# Altium schematic symbol library Altium_Lib.SchLib: 403 symbols (part 3 of 4) (continued)
## RELAY__PCH-105L2M,000 (continued)
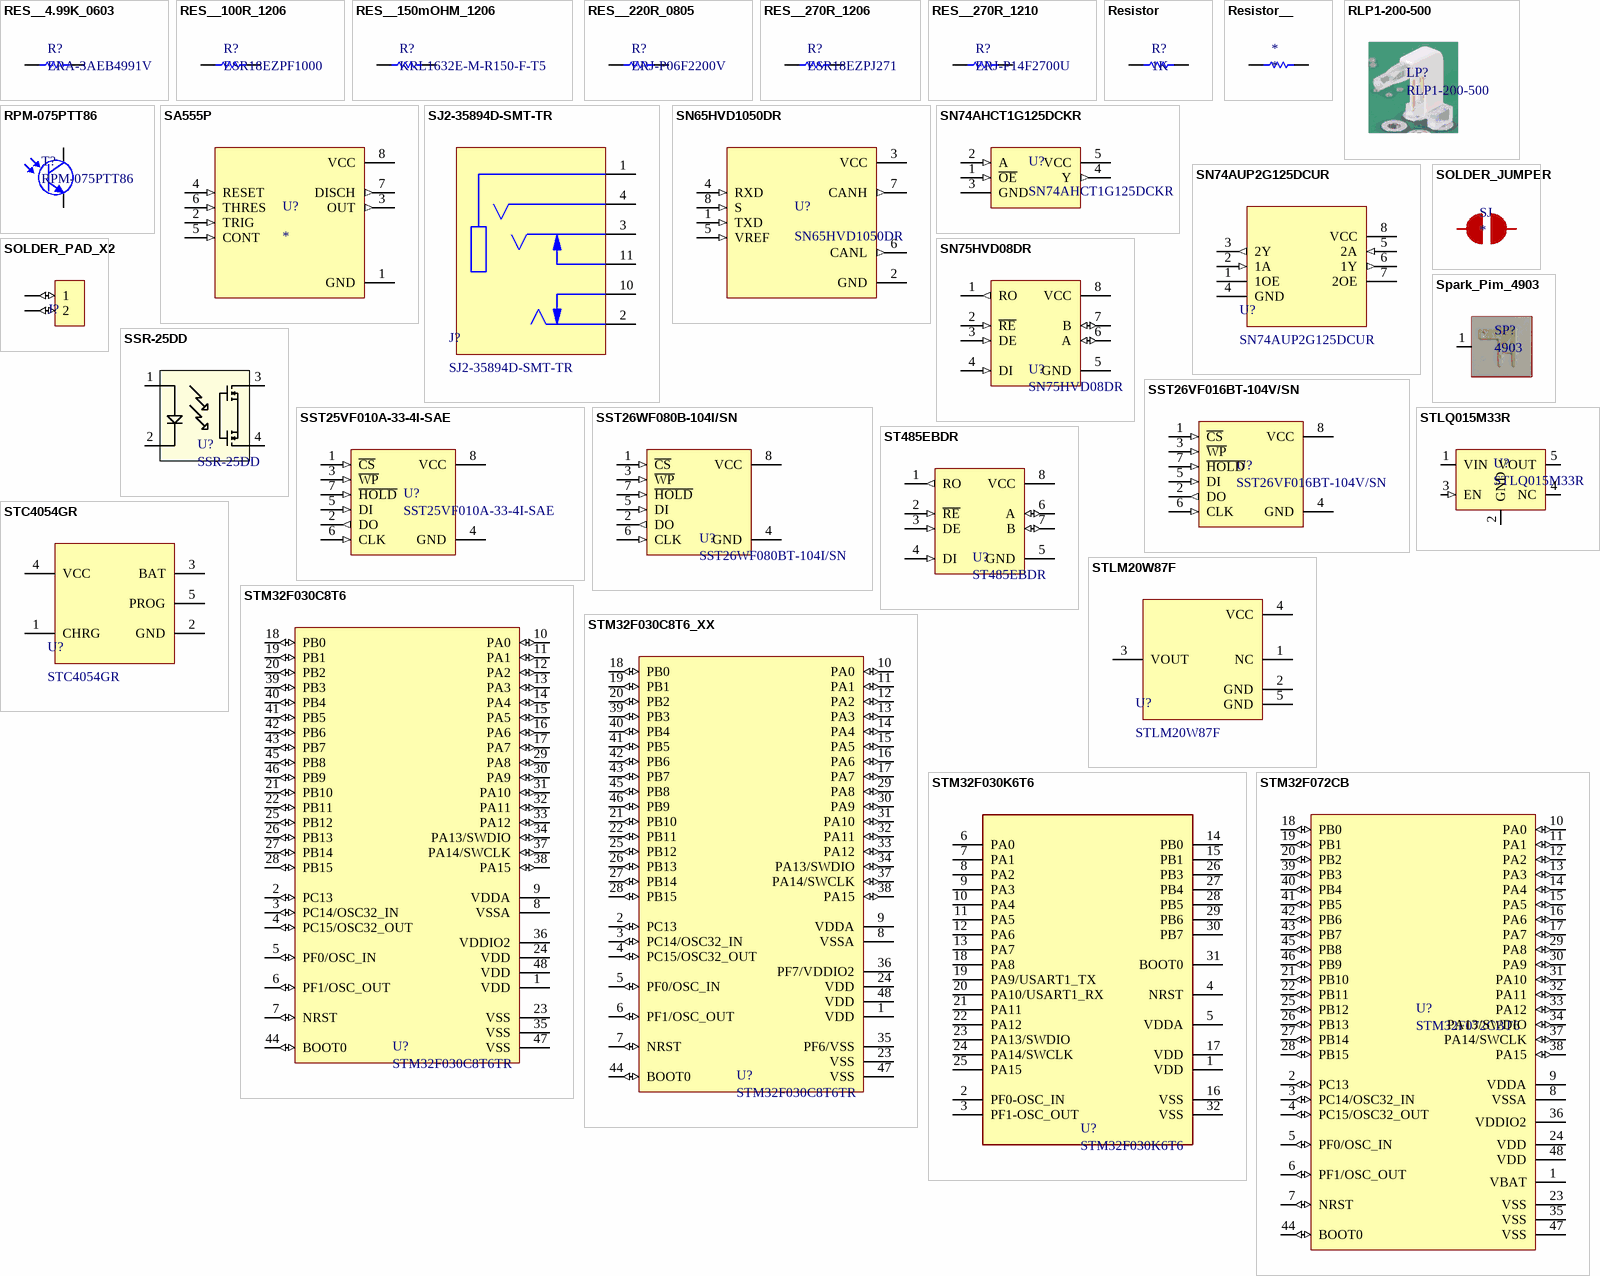
[diagram p8: symbols RES__4.99K_0603 to STM32F072CB]

## RES__4.99K_0603
designator R?, comment ERA-3AEB4991V
RES SMD 4.99KOHM 0.1% 1/10W 0603; Manufacturer: Panasonic Electronic Components; Temperature Coefficient: ±25ppm/°C; Power (Watts): 0.1W, 1/10W; Resistance: 4.99K; Height - Seated (Max): 0.022" (0.55mm); Supplier Device Package: 0603; Size / Dimension: 0.063" L x 0.032" W (1.60mm x 0.80mm); Failure Rate: -; Composition: Thin Film; Tolerance: ±0.1%; Operating Temperature: -55°C ~ 155°C; Package / Case: 0603 (1608 Metric); Supplier: Digi-Key; Packaging: Cut Tape (CT); Part Status: Active; RoHS: RoHS Compliant; Manufacturer Part Number: ERA-3AEB4991V; Category: Resistors; Features: Automotive AEC-Q200; ComponentLink1URL: https://industrial.panasonic.com/cdbs/www-data/pdf/RDM0000/AOA0000C307.pdf; ComponentLink1Description: https://industrial.panasonic.com/cdbs/www-data/pdf/RDM0000/AOA0000C307.pdf; Pricing: 1=0.35, 10=0.3, 100=0.1172, 1000=0.04906, 2500=0.04498 (USD); Supplier Part Number: P4.99KDBCT-ND
footprint R-0603 (Chip Resistor; Body 1.6 x 0.8 mm (LxW typ))
pins: 1, 2

## RES__100R_1206
designator R?, comment ESR18EZPF1000
RES SMD 100 OHM 1% 1/2W 1206; Manufacturer: Rohm Semiconductor; Temperature Coefficient: ±100ppm/°C; Power (Watts): 0.5W, 1/2W; Resistance: 100 Ohms; Supplier: Digi-Key; Category: Resistors; RoHS: RoHS Compliant; Manufacturer Part Number: ESR18EZPF1000; Operating Temperature: -55°C ~ 155°C; Failure Rate: -; Composition: Thick Film; Features: Automotive AEC-Q200, Pulse Withstanding; Package / Case: 1206 (3216 Metric); Supplier Device Package: 1206; Part Status: Active; Tolerance: ±1%; Height - Seated (Max): 0.026" (0.65mm); Size / Dimension: 0.126" L x 0.063" W (3.20mm x 1.60mm); Packaging: Cut Tape (CT); ComponentLink1URL: https://www.rohm.com/datasheet/ESR01MZPF/esr-e; ComponentLink1Description: https://www.rohm.com/datasheet/ESR01MZPF/esr-e; Pricing: 1=0.16, 10=0.133, 100=0.052, 1000=0.02178, 2500=0.01996 (USD); Supplier Part Number: RHM100AFCT-ND
footprint R-1206 (Chip Resistor; Body 3.2 x 1.6 mm (LxW typ))
pins: 1, 2

## RES__150mOHM_1206
designator R?, comment KRL1632E-M-R150-F-T5
RES 0.15 OHM 1% 3/4W 1206; Manufacturer: Susumu; Temperature Coefficient: ±50ppm/°C; Power (Watts): 0.75W, 3/4W; Resistance: 150mOHM; Manufacturer Part Number: KRL1632E-M-R150-F-T5; Category: Resistors; Supplier: Digi-Key; RoHS: RoHS Compliant; Packaging: Cut Tape (CT); Failure Rate: -; Tolerance: ±1%; Features: Automotive AEC-Q200, Current Sense; Operating Temperature: -55°C ~ 155°C; Part Status: Active; Height - Seated (Max): 0.028" (0.70mm); Supplier Device Package: 1206; Package / Case: 1206 (3216 Metric); Size / Dimension: 0.126" L x 0.063" W (3.20mm x 1.60mm); Composition: Metal Foil; ComponentLink1URL: http://www.susumu.co.jp/common/pdf/n_catalog_partition09_en.pdf; ComponentLink1Description: http://www.susumu.co.jp/common/pdf/n_catalog_partition09_en.pdf; Pricing: 1=0.54, 10=0.385, 25=0.3004, 50=0.2542, 100=0.2002, 250=0.1694, 500=0.1386, 1000=0.1078 (USD); Supplier Part Number: 408-1584-1-ND
footprint R-1206 (Chip Resistor; Body 3.2 x 1.6 mm (LxW typ))
pins: 1, 2

## RES__220R_0805
designator R?, comment ERJ-P06F2200V
RES SMD 220 OHM 1% 1/2W 0805; Manufacturer: Panasonic; Power Rating: 500 mW (1/2 W); Resistance: 220 Ohms; Temperature Coefficient: 300 PPM / C; Voltage Rating: 400 V; Qualification: AEC-Q200; Supplier 1: Mouser; Manufacturer Part Number: ERJ-P06F2200V; RoHS: RoHS Compliant By Exemption; Category: Thick Film Resistors - SMD; Stock 1: 11916; Pricing 1: 1=0.180, 10=0.098, 50=0.081, 100=0.055, 500=0.036, 1000=0.025, 5000=0.021 (USD); Application: Automotive Grade; Features: Anti-Surge Resistors; Height: 0.6 mm; Length: 2 mm; Package / Case: -; Packaging: Cut Tape; Product: Thick Film Resistors SMD; Series: ERJ-P; Technology: Thick Film; Termination Style: SMD/SMT; Tolerance: 1 %; Type: Anti-Surge Resistor; Width: 1.2 mm; Brand: Panasonic; Mounting Style: PCB Mount; Case Code - in: 0805; Case Code - mm: 2012; Maximum Operating Temperature: + 155 C; Minimum Operating Temperature: - 55 C; Product Type: Thick Film Resistors; Standard Pack Qty: 5000; Subcategory: Resistors; RoHS - Mouser: E; Minimum Order Quantity: 1; Reeling: True; ComponentLink1URL: https://www.mouser.com/datasheet/2/315/AOA0000C331-1141874.pdf; ComponentLink1Description: https://www.mouser.com/datasheet/2/315/AOA0000C331-1141874.pdf; Supplier Part Number 1: 667-ERJ-P06F2200V
footprint R-0805 (Chip Resistor; Body 2.0 x 1.3 mm (LxW typ))
pins: 1, 2

## RES__270R_1206
designator R?, comment ESR18EZPJ271
RES SMD 270 OHM 5% 1/2W 1206; Manufacturer: Rohm Semiconductor; Power (Watts): 0.5W, 1/2W; Temperature Coefficient: ±200ppm/°C; Resistance: 270 Ohms; Manufacturer Part Number: ESR18EZPJ271; RoHS: RoHS Compliant; Supplier: Digi-Key; Supplier Device Package: 1206; Packaging: Cut Tape (CT); Composition: Thick Film; Part Status: Active; Tolerance: ±5%; Height - Seated (Max): 0.026" (0.65mm); Features: Automotive AEC-Q200, Pulse Withstanding; Package / Case: 1206 (3216 Metric); Failure Rate: -; Operating Temperature: -55°C ~ 155°C; Size / Dimension: 0.126" L x 0.063" W (3.20mm x 1.60mm); Category: Resistors; ComponentLink1URL: https://www.rohm.com/datasheet/ESR01MZPF/esr-e; ComponentLink1Description: https://www.rohm.com/datasheet/ESR01MZPF/esr-e; Pricing: 1=0.17, 10=0.146, 100=0.0572, 1000=0.02396, 2500=0.02196 (USD); Supplier Part Number: RHM270ICT-ND
footprint R-1206 (Chip Resistor; Body 3.2 x 1.6 mm (LxW typ))
pins: 1, 2

## RES__270R_1210
designator R?, comment ERJ-P14F2700U
RES SMD 270 OHM 1% 1/2W 1210; Manufacturer: Panasonic Electronic Components; Power (Watts): 0.5W, 1/2W; Temperature Coefficient: ±100ppm/°C; Resistance: 270; Part Status: Active; Failure Rate: -; Composition: Thick Film; Tolerance: ±1%; Category: Resistors; Manufacturer Part Number: ERJ-P14F2700U; Operating Temperature: -55°C ~ 155°C; Supplier Device Package: 1210; Packaging: Cut Tape (CT); Supplier: Digi-Key; Features: Automotive AEC-Q200, Pulse Withstanding; Package / Case: 1210 (3225 Metric); Size / Dimension: 0.126" L x 0.098" W (3.20mm x 2.50mm); RoHS: RoHS Compliant; Height - Seated (Max): 0.028" (0.70mm); ComponentLink1URL: https://industrial.panasonic.com/cdbs/www-data/pdf/RDO0000/AOA0000C331.pdf; ComponentLink1Description: https://industrial.panasonic.com/cdbs/www-data/pdf/RDO0000/AOA0000C331.pdf; Pricing: 1=0.54, 10=0.387, 100=0.1548, 1000=0.07628, 2500=0.07067 (USD); Supplier Part Number: P16108CT-ND
footprint R-1210 (Chip Resistor; Body 3.2 x 2.5 mm (LxW typ))
pins: 1, 2

## Resistor
designator R?, comment 1K
Manufacturer Part Number: 1K
footprint R-0402 (Chip Resistor, 2-Leads, Body 1.0x0.5mm, IPC Medium Density)
footprint R-0603 (Chip Resistor; Body 1.6 x 0.8 mm (LxW typ))
footprint R-0805 (Chip Resistor; Body 2.0 x 1.3 mm (LxW typ))
footprint R-1206 (Chip Resistor; Body 3.2 x 1.6 mm (LxW typ))
footprint R-1210 (Chip Resistor; Body 3.2 x 2.5 mm (LxW typ))
footprint R-2512 (Chip Resistor; Body 6.3 x 3.2 mm (LxW typ))
pins: 1, 2

## Resistor__
designator *
footprint R-0402 (Chip Resistor, 2-Leads, Body 1.0x0.5mm, IPC Medium Density)
pins: 1, 2

## RLP1-200-500
designator LP?
RIGHT ANGLE LIGHT PIPE, 2.8MM; Manufacturer: Bivar Inc.; Lens Style: Round with Flat Top; Configuration: Single; Lens Size: 2.8mm; Mounting Type: Board Mount, Snap-In, Right Angle; Type: Rigid; Supplier: Digi-Key; Color: Clear; Part Status: Active; RoHS: RoHS Compliant; Category: Optoelectronics; Manufacturer Part Number: RLP1-200-500; ComponentLink1URL: http://www.bivar.com/portals/0/products/RLP1-XXX-XXX.pdf; ComponentLink1Description: http://www.bivar.com/portals/0/products/RLP1-XXX-XXX.pdf; Pricing: 1=1.37, 10=1.112, 25=0.8552, 100=0.7695, 250=0.684, 500=0.5814, 1000=0.4788, 2500=0.456 (USD); Stock: 13046; Supplier Part Number: 492-1462-ND
footprint RLP1-200-500

## RPM-075PTT86
designator T?
PHOTOTRANS 600NM 0805 SMD; Manufacturer: Rohm Semiconductor; Viewing Angle: 120°; Current - Collector (Ic) (Max): 10mA; Voltage - Collector Emitter Breakdown (Max): 20V; Power - Max: 50mW; Part Status: Not For New Designs; Wavelength: 600nm; Category: Sensors, Transducers; Operating Temperature: -30°C ~ 85°C (TA); Orientation: Top View; Mounting Type: Surface Mount; Supplier: Digi-Key; Package / Case: Nonstandard SMD; Manufacturer Part Number: RPM-075PTT86; RoHS: RoHS Compliant; Packaging: Tape & Reel (TR); ComponentLink1URL: http://media.digikey.com/pdf/Data%20Sheets/Rohm%20PDFs/RPM-075PT.pdf; ComponentLink1Description: http://media.digikey.com/pdf/Data%20Sheets/Rohm%20PDFs/RPM-075PT.pdf; Pricing: 3000=0.2352, 6000=0.2268, 15000=0.22344, 30000=0.2184 (USD); Supplier Part Number: 511-1356-2-ND
footprint P-0805
pins: 1 E, 2 C

## SA555P
designator U?
Precision timer for -55 to 85C operation 8-PDIP -40 to 85; MF: Texas Instruments; MP: SA555P; Max Supply Voltage: 16V; Min Supply Voltage: 4.5V; Number of Timers/Counters: 1; Frequency: 500kHz; High Level Output Current: -200mA; Operating Supply Current: 10mA; Quiescent Current: 15mA; Low Level Output Current: 200mA; Operating Supply Voltage: 5V; Check_prices: https://www.snapeda.com/parts/SA555P/Texas%20Instruments/view-part/46237/?ref=eda; SnapEDA_Link: https://www.snapeda.com/parts/SA555P/Texas%20Instruments/view-part/46237/?ref=snap; Digi-Key_Part_Number: SA555PG4-ND; Value: *; Purchase-URL: https://pricing.snapeda.com/search/part/SA555P/?ref=eda; Package: PDIP-8 Texas; Supplier 1: Digi-Key; Manufacturer: Texas Instruments; Manufacturer Part Number: SA555P; RoHS: Yes; Category: Timers and Oscillators; Stock 1: 3835; Pricing 1: 1=0,46000, 10=0,37400, 25=0,34200, 100=0,25460, 250=0,23076, 500=0,19098, 1000=0,14323, 2500=0,13137 (USD); Mount: Through Hole; Case/Package: PDIP; Number of Pins: 8; Weight: 0.015535oz; Contact Plating: Gold; Min Operating Temperature: -40°C; Max Operating Temperature: 85°C; Packaging: Rail/Tube; Package Quantity: 50; Input Current: 15mA; Length: 9.81mm; Width: 6.35mm; Height: 4.57mm; Radiation Hardening: No; REACH SVHC: No SVHC; Lead Free: Lead Free; RoHS Compliant: Yes; ComponentLink1URL: https://datasheet.ciiva.com/14094/ne555-series-eng-tds-14094952.pdf?src-supplier=Distrelec; ComponentLink1Description: https://datasheet.ciiva.com/14094/ne555-series-eng-tds-14094952.pdf?src-supplier=Distrelec; ComponentLink2URL: https://datasheet.ciiva.com/1492/1851962-1492581.pdf?src-supplier=Element14; ComponentLink2Description: https://datasheet.ciiva.com/1492/1851962-1492581.pdf?src-supplier=Element14; ComponentLink3URL: https://datasheet.ciiva.com/1233/sa555-1233482.pdf?src-supplier=Digi-Key; ComponentLink3Description: https://datasheet.ciiva.com/1233/sa555-1233482.pdf?src-supplier=Digi-Key; ComponentLink4URL: https://datasheet.ciiva.com/19480/909290-19480021.pdf?src-supplier=Jameco; ComponentLink4Description: https://datasheet.ciiva.com/19480/909290-19480021.pdf?src-supplier=Jameco; ComponentLink5URL: https://datasheet.ciiva.com/14274/se555m-14274472.pdf?src-supplier=Avnet; ComponentLink5Description: https://datasheet.ciiva.com/14274/se555m-14274472.pdf?src-supplier=Avnet; ComponentLink6URL: https://datasheet.ciiva.com/15152/getdatasheetpartid-39665-15152541.pdf?src-supplier=Verical; ComponentLink6Description: https://datasheet.ciiva.com/15152/getdatasheetpartid-39665-15152541.pdf?src-supplier=Verical; ComponentLink7URL: https://datasheet.ciiva.com/26228/se555m-26228889.pdf?src-supplier=Avnet+Europe; ComponentLink7Description: https://datasheet.ciiva.com/26228/se555m-26228889.pdf?src-supplier=Avnet+Europe; ComponentLink8URL: https://datasheet.ciiva.com/29305/152223-da-01-en-sa555p-timer-tid-29305226.pdf?src-supplier=Conrad; ComponentLink8Description: https://datasheet.ciiva.com/29305/152223-da-01-en-sa555p-timer-tid-29305226.pdf?src-supplier=Conrad; Supplier Part Number 1: 296-9682-5-ND
footprint PDIP-8 (Footprint not found)
pins: 1 GND (power), 2 TRIG (in), 3 OUT (out), 4 RESET (in), 5 CONT (in), 6 THRES (in), 7 DISCH (out), 8 VCC (power)

## SJ2-35894D-SMT-TR
designator J?
3.5 mm, Stereo, Right Angle, Surface Mount (SMT), Audio Jack Connector; Manufacturer: CUI; Number of Conductors: 4; Number of Ports: 1; Shielding: Unshielded; Supplier 1: Digi-Key; Manufacturer Part Number: SJ2-35894D-SMT-TR; RoHS: Yes; Category: Audio / Video Cables; Color: Black; Connector Type: Jack; Orientation: Horizontal; ComponentLink1URL: https://www.cui.com/product/resource/digikeypdf/sj2-3589x-smt.pdf?src-supplier=Digi-Key; ComponentLink1Description: https://www.cui.com/product/resource/digikeypdf/sj2-3589x-smt.pdf?src-supplier=Digi-Key; Supplier Part Number 1: CP-SJ2-35894D-SMT-CT-ND
footprint CUI_SJ2-35894D-SMT-TR (Footprint not found)
pins: 1 SLEEVE, 2 TIP, 3 RING1, 4 RING2, 10 TIP_SWITCH, 11 RING1_SWITCH

## SN65HVD1050DR
designator U?
High-Speed CAN Transceiver with Silent Mode 8-SOIC -40 to 125; MF: Texas Instruments; Min Supply Voltage: 4.75V; Max Supply Voltage: 5.25V; Data Rate: 1Mbps; Number of Transceivers: 1; Operating Supply Voltage: 5V; Nominal Supply Current: 70mA; Purchase-URL: https://pricing.snapeda.com/search/part/SN65HVD1050DR/?ref=eda; Digi-Key_Part_Number: 296-26335-1-ND; MP: SN65HVD1050DR; Check_prices: https://www.snapeda.com/parts/SN65HVD1050DR/Texas%20Instruments/view-part/1043210/?ref=eda; SnapEDA_Link: https://www.snapeda.com/parts/SN65HVD1050DR/Texas%20Instruments/view-part/1043210/?ref=snap; Value: *; Package: SOIC-8 Texas Instruments; Supplier 1: Digi-Key; Manufacturer: Texas Instruments; Manufacturer Part Number: SN65HVD1050DR; RoHS: Yes; Category: Interface ICs; Pricing 1: 1=1,69000, 10=1,51300, 25=1,43640, 100=1,18000, 250=1,10304, 500=0,97478, 1000=0,84700 (USD); Case/Package: D; Number of Pins: 8; Weight: 0.002677oz; Contact Plating: Gold; Min Operating Temperature: -40°C; Max Operating Temperature: 125°C; Packaging: Tape and Reel; Package Quantity: 2500; Max Supply Current: 70mA; Number of Drivers: 1; Number of Receivers: 1; Series: -; Supply Current: 70mA; Number of Transmit Buffers: 1; Number of Receive Buffers: 1; Radiation Hardening: No; Lead Free: Lead Free; RoHS Compliant: Yes; REACH SVHC: No SVHC; ComponentLink1URL: https://datasheet.ciiva.com/26828/sn65hvd1050dr-26828644.pdf?src-supplier=IIIC; ComponentLink1Description: https://datasheet.ciiva.com/26828/sn65hvd1050dr-26828644.pdf?src-supplier=IIIC; ComponentLink2URL: https://datasheet.ciiva.com/46392/1888948-46392549.pdf?src-supplier=Element14; ComponentLink2Description: https://datasheet.ciiva.com/46392/1888948-46392549.pdf?src-supplier=Element14; ComponentLink3URL: https://datasheet.ciiva.com/1701/sn65hvd1050-1701693.pdf?src-supplier=Digi-Key; ComponentLink3Description: https://datasheet.ciiva.com/1701/sn65hvd1050-1701693.pdf?src-supplier=Digi-Key; ComponentLink4URL: https://datasheet.ciiva.com/1701/sn65hvd1050-1701694.pdf?src-supplier=Digi-Key; ComponentLink4Description: https://datasheet.ciiva.com/1701/sn65hvd1050-1701694.pdf?src-supplier=Digi-Key; ComponentLink5URL: https://datasheet.ciiva.com/1701/sn65hvd1050-1701695.pdf?src-supplier=Digi-Key; ComponentLink5Description: https://datasheet.ciiva.com/1701/sn65hvd1050-1701695.pdf?src-supplier=Digi-Key; Supplier Part Number 1: 296-26335-6-ND
footprint SOIC-8_L (SOIC, 8-Leads, Body 4.9x3.9mm, Pitch 1.27mm, IPC High Density)
pins: 1 TXD (in), 2 GND (power), 3 VCC (power), 4 RXD (in), 5 VREF (in), 6 CANL (out), 7 CANH (out), 8 S (in)

## SN74AHCT1G125DCKR
designator U?
IC BUF NON-INVERT 5.5V SC70-5; Manufacturer: Texas Instruments; Voltage - Supply: 4.5 V ~ 5.5 V; Number of Bits per Element: 1; Logic Type: Buffer, Non-Inverting; Output Type: 3-State; Current - Output High, Low: 8mA, 8mA; Manufacturer Part Number: SN74AHCT1G125DCKR; Package / Case: 5-TSSOP, SC-70-5, SOT-353; Supplier: Digi-Key; RoHS: RoHS Compliant; Operating Temperature: -40°C ~ 125°C (TA); Part Status: Active; Input Type: -; Mounting Type: Surface Mount; Supplier Device Package: SC-70-5; Category: Integrated Circuits (ICs); Base Part Number: 74AHCT1G125; Packaging: Cut Tape (CT); ComponentLink1URL: http://www.ti.com/lit/ds/symlink/sn74ahct1g125.pdf; ComponentLink1Description: http://www.ti.com/lit/ds/symlink/sn74ahct1g125.pdf; Pricing: 1=0.43, 10=0.32, 100=0.1996, 500=0.13658, 1000=0.10506 (USD); Supplier Part Number: 296-4709-1-ND
footprint SC-70-5
pins: 1 ~{OE} (in), 2 A (in), 3 GND (power), 4 Y (out), 5 VCC (power)

## SN74AUP2G125DCUR
designator U?
Low-Power Dual Bus Buffer Gate With 3-State Outputs 8-VSSOP -40 to 85; Manufacturer: Texas Instruments; Max Supply Voltage: 3.6V; Min Supply Voltage: 800mV; Propagation Delay: 6.5ns; Number of Elements: 2; Logic Function: Buffer,Inverting; Low Level Output Current: 4mA; Number of Input Lines: 4; Polarity: Non-Inverting; Number of Bits per Element: 1; High Level Output Current: -4mA; Quiescent Current: 500nA; Supplier 1: Avnet; Manufacturer Part Number: SN74AUP2G125DCUR; Stock 1: 0; Mount: Surface Mount; Case/Package: VSSOP; Number of Pins: 8; Min Operating Temperature: -40°C; Max Operating Temperature: 85°C; Package Quantity: 3000; Packaging: Tape and Reel; Number of Channels: 2; Number of Inputs: 2; Number of Outputs: 2; Number of Output Lines: 4; Number of Bits: 2; Output Type: 3-STATE; Series: 74AUP; Technology: CMOS; Lead Free: Lead Free; RoHS Compliant: Yes; ComponentLink1URL: http://www.ti.com/lit/ds/symlink/sn74aup2g125.pdf?src-supplier=Digi-Key; ComponentLink1Description: http://www.ti.com/lit/ds/symlink/sn74aup2g125.pdf?src-supplier=Digi-Key; ComponentLink2URL: http://www.ti.com/general/docs/lit/getliterature.tsp?genericPartNumber=SN74AUP2G125&&fileType=pdf&src-supplier=Avnet; ComponentLink2Description: http://www.ti.com/general/docs/lit/getliterature.tsp?genericPartNumber=SN74AUP2G125&&fileType=pdf&src-supplier=Avnet; Supplier Part Number 1: SN74AUP2G125DCUR
footprint VFSOP_8
pins: 1 1OE, 2 1A (in), 3 2Y (out), 4 GND, 5 2A (in), 6 1Y (out), 7 2OE, 8 VCC

## SN75HVD08DR
designator U?
IC RS485 TXRX 3/5V 8-SOIC; Manufacturer: Texas Instruments; Number of Drivers/Receivers: 1/1; Protocol: RS422, RS485; Voltage - Supply: 3 V ~ 5.5 V; Data Rate: 10Mbps; Duplex: Half; Operating Temperature: 0°C ~ 70°C; RoHS: RoHS Compliant; Package / Case: 8-SOIC (0.154", 3.90mm Width); Mounting Type: Surface Mount; Supplier: Digi-Key; Supplier Device Package: 8-SOIC; Manufacturer Part Number: SN75HVD08DR; Packaging: Tape & Reel (TR); Part Status: Active; Category: Integrated Circuits (ICs); Type: Transceiver; ComponentLink1URL: http://www.ti.com/lit/ds/symlink/sn75hvd08.pdf; ComponentLink1Description: http://www.ti.com/lit/ds/symlink/sn75hvd08.pdf; Supplier Part Number: 296-37893-2-ND
footprint SOIC-8_L (SOIC, 8-Leads, Body 4.9x3.9mm, Pitch 1.27mm, IPC High Density)
pins: 1 RO (out), 2 ~{RE} (in), 3 DE (in), 4 DI (in), 5 GND (power), 6 A (io), 7 B (io), 8 VCC (power)

## SOLDER_JUMPER
designator SJ
Solder Jumper pad; Manufacturer Part Number: *; Manufacturer: *; ComponentLink1Description: *
footprint SOLDER_JUMPER
pins: 1, 2

## SOLDER_PAD_X2
designator J?  (value not drawn)  (no BOM)
Solder Pad; Manufacturer Part Number: *; Manufacturer: *
footprint SOLDER_PAD_X2
pins: 1 (io), 2 (io)

## Spark_Pim_4903
designator SP?, comment 4903
CONN QC TAB 0.110 SOLDER; Manufacturer: Keystone Electronics; Tab Thickness: 0.020" (0.51mm); Gender: Male; Insulation: Non-Insulated; Tab Width: 0.110" (2.79mm); Manufacturer Part Number: 4903; ComponentLink1Description: http://www.keyelco.com/product-pdf.cfm?p=593; Category: Connectors, Interconnects; Contact Material: Brass; Mounting Type: Through Hole, Right Angle; Tab Length: -; Color: -; Termination: Solder; Features: -; Packaging: Bulk; RoHS: RoHS Compliant; Part Status: Active; Supplier: Digi-Key; Contact Finish: Tin; Wire Gauge: -; Insulation Diameter: -; Length - Overall: -; Terminal Type: Standard; ComponentLink1URL: http://www.keyelco.com/product-pdf.cfm?p=593; Pricing: 1=0.3, 10=0.268, 50=0.1952, 100=0.1875, 250=0.1684, 1000=0.13396, 2500=0.12248, 5000=0.11483 (USD); Supplier Part Number: 36-4903-ND
footprint Spark_Pim_4803
pins: 1 (power)

## SSR-25DD
designator U?
Solid state relay DC input, DC output 25A; Manufacturer: FOTEK; Manufacturer Part Number: SSR-25DD
footprint SSR-25-DD
pins: 1 IN+, 2 IN-, 3 OUT, 4 OUT

## SST25VF010A-33-4I-SAE
designator U?
IC FLASH 1MBIT 33MHZ 8SOIC; Manufacturer: Microchip Technology; Interface: SPI Serial; Memory Type: FLASH - NOR; Memory Size: 1M (128K x 8); Voltage - Supply: 2.7 V ~ 3.6 V; Category: Integrated Circuits (ICs); Format - Memory: FLASH; Manufacturer Part Number: SST25VF010A-33-4I-SAE; Operating Temperature: -40°C ~ 85°C (TA); Package / Case: 8-SOIC (0.154", 3.90mm Width); Packaging: Tube; Part Status: Active; RoHS: RoHS Compliant; Speed: 33MHz; Supplier: Digi-Key; Supplier Device Package: 8-SOIC; ComponentLink1URL: http://www.microchip.com/mymicrochip/filehandler.aspx?ddocname=en550392; ComponentLink1Description: http://www.microchip.com/mymicrochip/filehandler.aspx?ddocname=en550392; Pricing: 1=0.58 (USD); Supplier Part Number: SST25VF010A-33-4I-SAE-ND
footprint SOIC-8_L (SOIC, 8-Leads, Body 4.9x3.9mm, Pitch 1.27mm, IPC High Density)
pins: 1 ~{CS} (in), 2 DO (out), 3 ~{WP} (in), 4 GND (power), 5 DI (in), 6 CLK (in), 7 ~{HOLD} (in), 8 VCC (power)

## SST26VF016BT-104V/SN
designator U?
IC FLASH 16MBIT 104MHZ 8SOIC; Manufacturer: Microchip Technology; Interface: SQI, SPI; Memory Size: 16M (2M x 8); Memory Type: FLASH - NOR; Voltage - Supply: 2.7 V ~ 3.6 V; Category: Integrated Circuits (ICs); Format - Memory: FLASH; Manufacturer Part Number: SST26VF016BT-104V/SN; Operating Temperature: -40°C ~ 105°C (TA); Package / Case: 8-SOIC (0.154", 3.90mm Width); Packaging: Tape & Reel (TR); Part Status: Active; RoHS: RoHS Compliant; Speed: 104MHz; Supplier: Digi-Key; Supplier Device Package: 8-SOIC; ComponentLink1URL: http://www.microchip.com/mymicrochip/filehandler.aspx?ddocname=en569522; ComponentLink1Description: http://www.microchip.com/mymicrochip/filehandler.aspx?ddocname=en569522; Pricing: 3300=1.38241 (USD); Supplier Part Number: SST26VF016BT-104V/SN-ND; Mounting Type: Surface Mount
footprint SOIC-8_L (SOIC, 8-Leads, Body 4.9x3.9mm, Pitch 1.27mm, IPC High Density)
pins: 1 ~{CS} (in), 2 DO (out), 3 ~{WP} (in), 4 GND (power), 5 DI (in), 6 CLK (in), 7 ~{HOLD} (in), 8 VCC (power)

## SST26WF080B-104I/SN
designator U?, comment SST26WF080BT-104I/SN
IC FLASH 8MBIT 104MHZ 8SOIC; Manufacturer: Microchip Technology; Write Cycle Time - Word, Page: 1.5ms; Memory Size: 8Mb (1M x 8); Memory Type: Non-Volatile; Memory Interface: SPI - Quad I/O; Voltage - Supply: 1.65 V ~ 1.95 V; Supplier 1: Digi-Key; Access Time: -; Operating Temperature: -40°C ~ 85°C (TA); Technology: FLASH; Packaging: Tape & Reel (TR); Part Status: Active; Category: Integrated Circuits (ICs); Package / Case: 8-SOIC (0.154", 3.90mm Width); Supplier Device Package: 8-SOIC; Manufacturer Part Number: SST26WF080BT-104I/SN; Memory Format: FLASH; Mounting Type: Surface Mount; RoHS: RoHS Compliant; Supplier: Digi-Key; ComponentLink1URL: http://www.microchip.com/mymicrochip/filehandler.aspx?ddocname=en572126; ComponentLink1Description: http://www.microchip.com/mymicrochip/filehandler.aspx?ddocname=en572126; Supplier Part Number: SST26WF080BT-104I/SN-ND
footprint SOIC-8_L (SOIC, 8-Leads, Body 4.9x3.9mm, Pitch 1.27mm, IPC High Density)
pins: 1 ~{CS} (in), 2 DO (out), 3 ~{WP} (in), 4 GND (power), 5 DI (in), 6 CLK (in), 7 ~{HOLD} (in), 8 VCC (power)

## ST485EBDR
designator U?
IC TXRX LOPWR RS485/422 8 SOIC; Manufacturer: STMicroelectronics; Protocol: RS422, RS485; Duplex: Half; Voltage - Supply: 4.75 V ~ 5.25 V; Number of Drivers/Receivers: 1/1; Data Rate: 5Mbps; Manufacturer Part Number: ST485EBDR; Type: Transceiver; RoHS: RoHS Compliant; Packaging: Tape & Reel (TR); Supplier: Digi-Key; Operating Temperature: -40°C ~ 85°C; Mounting Type: Surface Mount; Category: Integrated Circuits (ICs); Part Status: Active; Package / Case: 8-SOIC (0.154", 3.90mm Width); Supplier Device Package: 8-SO; ComponentLink1URL: http://www.st.com/content/ccc/resource/technical/document/datasheet/99/73/eb/42/c1/c3/4f/e9/CD00002703.pdf/files/CD00002703.pdf/jcr:content/translations/en.CD00002703.pdf; ComponentLink1Description: http://www.st.com/content/ccc/resource/technical/document/datasheet/99/73/eb/42/c1/c3/4f/e9/CD00002703.pdf/files/CD00002703.pdf/jcr:content/translations/en.CD00002703.pdf; Pricing: 2500=0.3962, 5000=0.37639, 12500=0.36224, 25000=0.35092 (USD); Supplier Part Number: 497-2083-2-ND
footprint SOIC-8_L (SOIC, 8-Leads, Body 4.9x3.9mm, Pitch 1.27mm, IPC High Density)
pins: 1 RO (out), 2 ~{RE} (in), 3 DE (in), 4 DI (in), 5 GND (power), 6 A (io), 7 B (io), 8 VCC (power)

## STC4054GR
designator U?
IC BATT CHG LI-ION 1CEL TSOT23-5; Manufacturer: STMicroelectronics; Output Voltage: 4.2V; Min Supply Voltage: 4.25V; Max Supply Voltage: 6.5V; Output Current: 800mA; Supplier 1: Avnet; Manufacturer Part Number: STC4054GR; Stock 1: 0; Pricing 1: 3000=0.7119, 6000=0.7013, 12000=0.6907, 18000=0.6854, 24000=0.6774, 30000=0.6641, 300000=0.6535 (USD); Mount: Surface Mount; Case/Package: SOT-23-5; Number of Pins: 23; Contact Plating: Gold; Min Operating Temperature: -40°C; Max Operating Temperature: 85°C; Packaging: Tape and Reel; Package Quantity: 1; Max Input Voltage: 6.5V; Min Input Voltage: 4.2V; Max Output Current: 800mA; Series: -; Radiation Hardening: No; Lead Free: Lead Free; RoHS Compliant: Yes; ComponentLink1URL: http://www.st.com/content/ccc/resource/technical/document/datasheet/df/b9/e6/5b/ec/92/45/ed/CD00132951.pdf/files/CD00132951.pdf/jcr:content/translations/en.CD00132951.pdf?src-supplier=Digi-Key; ComponentLink1Description: http://www.st.com/content/ccc/resource/technical/document/datasheet/df/b9/e6/5b/ec/92/45/ed/CD00132951.pdf/files/CD00132951.pdf/jcr:content/translations/en.CD00132951.pdf?src-supplier=Digi-Key; ComponentLink2URL: http://www.mouser.com/ds/2/389/stc4054-974249.pdf?src-supplier=Mouser; ComponentLink2Description: http://www.mouser.com/ds/2/389/stc4054-974249.pdf?src-supplier=Mouser; ComponentLink3URL: http://www.st.com/web/en/resource/technical/document/datasheet/CD00132951.pdf?src-supplier=Avnet; ComponentLink3Description: http://www.st.com/web/en/resource/technical/document/datasheet/CD00132951.pdf?src-supplier=Avnet; ComponentLink4URL: http://www.st.com/web/en/resource/technical/document/datasheet/CD00132951.pdf?src-supplier=Avnet+Europe; ComponentLink4Description: http://www.st.com/web/en/resource/technical/document/datasheet/CD00132951.pdf?src-supplier=Avnet+Europe; Supplier Part Number 1: STC4054GR
footprint SOT23-5 (SOT23, 5-Leads, Body 3,0x3,0mm (max), Pitch 0,95mm, IPC Low Density)
pins: 1 CHRG, 2 GND, 3 BAT, 4 VCC, 5 PROG

## STLM20W87F
designator U?
SENS TEMP ANLG VOLT SOT-323-5; Manufacturer: STMicroelectronics; Output Type: Analog Voltage,Analog; Output Voltage: 1.864V; Min Supply Voltage: 2.4V; Max Supply Voltage: 5.5V; Output Current: 10mA; Nominal Supply Current: 8uA; Supplier 1: Avnet; Manufacturer Part Number: STLM20W87F; Stock 1: 0; Pricing 1: 3000=0.326, 6000=0.3212, 12000=0.3163, 18000=0.3139, 24000=0.3102, 30000=0.3041, 300000=0.2993 (USD); Mount: Surface Mount; Case/Package: SOT-323-5; Number of Pins: 5; Min Operating Temperature: -55°C; Max Operating Temperature: 130°C; Package Quantity: 3000; Packaging: Tape and Reel; Series: STLM20; Max Supply Voltage (DC): 5.5V; Min Supply Voltage (DC): 2.4V; Operating Supply Current: 8uA; Termination: SMD/SMT; Supply Current: 8uA; Length: 2.2mm; Width: 1.35mm; Height: 1mm; Radiation Hardening: No; Lead Free: Lead Free; REACH SVHC: No SVHC; RoHS Compliant: Yes; ComponentLink1URL: http://www.farnell.com/datasheets/1837140.pdf?src-supplier=Element14; ComponentLink1Description: http://www.farnell.com/datasheets/1837140.pdf?src-supplier=Element14; ComponentLink2URL: http://www.st.com/content/ccc/resource/technical/document/datasheet/61/83/f6/8b/2f/2a/47/35/CD00119601.pdf/files/CD00119601.pdf/jcr:content/translations/en.CD00119601.pdf?src-supplier=Digi-Key; ComponentLink2Description: http://www.st.com/content/ccc/resource/technical/document/datasheet/61/83/f6/8b/2f/2a/47/35/CD00119601.pdf/files/CD00119601.pdf/jcr:content/translations/en.CD00119601.pdf?src-supplier=Digi-Key; ComponentLink3URL: https://www.verical.com/server-webapp/html/getDatasheet?partID=50614&src-supplier=Verical; ComponentLink3Description: https://www.verical.com/server-webapp/html/getDatasheet?partID=50614&src-supplier=Verical; ComponentLink4URL: http://www.st.com/web/en/resource/technical/document/datasheet/CD00119601.pdf?src-supplier=Avnet+Europe; ComponentLink4Description: http://www.st.com/web/en/resource/technical/document/datasheet/CD00119601.pdf?src-supplier=Avnet+Europe; Supplier Part Number 1: STLM20W87F
footprint SC-70-5
pins: 1 NC, 2 GND, 3 VOUT, 4 VCC, 5 GND

## STLQ015M33R
designator U?
IC REG LINEAR 3.3V 150MA SOT23-5; Manufacturer: STMicroelectronics; Output Type: Fixed; Output Configuration: Positive; Voltage Dropout (Max): 0.3V @ 150mA; Protection Features: Over Current, Over Temperature; Voltage - Input (Max): 5.5V; Control Features: Enable; PSRR: 40dB ~ 15dB (1kHz ~ 100kHz); Voltage - Output (Min/Fixed): 3.3V; Part Status: Active; Current - Output: 150mA; Mounting Type: Surface Mount; Operating Temperature: -40°C ~ 125°C; RoHS: RoHS Compliant; Supplier Device Package: SOT-23-5; Category: Integrated Circuits (ICs); Packaging: Tape & Reel (TR); Voltage - Output (Max): -; Supplier: Digi-Key; Manufacturer Part Number: STLQ015M33R; Package / Case: SC-74A, SOT-753; ComponentLink1URL: http://www.st.com/content/ccc/resource/technical/document/datasheet/35/54/c9/ad/3b/07/4a/c3/CD00268765.pdf/files/CD00268765.pdf/jcr:content/translations/en.CD00268765.pdf; ComponentLink1Description: http://www.st.com/content/ccc/resource/technical/document/datasheet/35/54/c9/ad/3b/07/4a/c3/CD00268765.pdf/files/CD00268765.pdf/jcr:content/translations/en.CD00268765.pdf; Pricing: 3000=0.29, 6000=0.27, 15000=0.26, 30000=0.25 (USD); Supplier Part Number: 497-15934-2-ND
footprint SOT23-5 (SOT-23/SC-74A; 5 Leads; Body 3 x 3 mm, inc. leads (LxW max))
pins: 1 VIN (power), 2 GND (power), 3 EN (in), 4 NC, 5 VOUT (power)

## STM32F030C8T6
designator U?, comment STM32F030C8T6TR
IC MCU 32BIT 64KB FLASH 48LQFP; Manufacturer: STMicroelectronics; Connectivity: I²C, SPI, UART/USART; Peripherals: DMA, POR, PWM, WDT; RAM Size: 8K x 8; Program Memory Size: 64KB (64K x 8); Voltage - Supply (Vcc/Vdd): 2.4 V ~ 3.6 V; Oscillator Type: Internal; Core Processor: ARM® Cortex®-M0; Number of I/O: 39; Speed: 48MHz; Core Size: 32-Bit; Data Converters: A/D 12x12b; Program Memory Type: FLASH; Manufacturer Part Number: STM32F030C8T6TR; Package / Case: 48-LQFP; Operating Temperature: -40°C ~ 85°C (TA); Supplier Device Package: 48-LQFP (7x7); Category: Integrated Circuits (ICs); EEPROM Size: -; Packaging: Tape & Reel (TR); RoHS: RoHS Compliant; Part Status: Active; Supplier: Digi-Key; ComponentLink1URL: http://www.st.com/content/ccc/resource/technical/document/datasheet/a4/5d/0b/0e/87/c4/4d/71/DM00088500.pdf/files/DM00088500.pdf/jcr:content/translations/en.DM00088500.pdf; ComponentLink1Description: http://www.st.com/content/ccc/resource/technical/document/datasheet/a4/5d/0b/0e/87/c4/4d/71/DM00088500.pdf/files/DM00088500.pdf/jcr:content/translations/en.DM00088500.pdf; Supplier Part Number: 497-17331-2-ND; Mounting Type: Surface Mount
footprint LQFP-48-7x7 (hin QFP, 48-Leads, Body 7x7mm, Pitch 0.5mm, IPC Medium Density)
pins: 1 VDD (power), 2 PC13 (io), 3 PC14/OSC32_IN (io), 4 PC15/OSC32_OUT (io), 5 PF0/OSC_IN (io), 6 PF1/OSC_OUT (io), 7 NRST (io), 8 VSSA (power), 9 VDDA (power), 10 PA0 (io), 11 PA1 (io), 12 PA2 (io), 13 PA3 (io), 14 PA4 (io), 15 PA5 (io), 16 PA6 (io), 17 PA7 (io), 18 PB0 (io), 19 PB1 (io), 20 PB2 (io), 21 PB10 (io), 22 PB11 (io), 23 VSS (power), 24 VDD (power), 25 PB12 (io), 26 PB13 (io), 27 PB14 (io), 28 PB15 (io), 29 PA8 (io), 30 PA9 (io), 31 PA10 (io), 32 PA11 (io), 33 PA12 (io), 34 PA13/SWDIO (io), 35 VSS (power), 36 VDDIO2 (power), 37 PA14/SWCLK (io), 38 PA15 (io), 39 PB3 (io), 40 PB4 (io), 41 PB5 (io), 42 PB6 (io), 43 PB7 (io), 44 BOOT0 (io), 45 PB8 (io), 46 PB9 (io), 47 VSS (power), 48 VDD (power)

## STM32F030C8T6_XX
designator U?, comment STM32F030C8T6TR
IC MCU 32BIT 64KB FLASH 48LQFP; Manufacturer: STMicroelectronics; Connectivity: I²C, SPI, UART/USART; Peripherals: DMA, POR, PWM, WDT; RAM Size: 8K x 8; Program Memory Size: 64KB (64K x 8); Voltage - Supply (Vcc/Vdd): 2.4 V ~ 3.6 V; Oscillator Type: Internal; Core Processor: ARM® Cortex®-M0; Number of I/O: 39; Speed: 48MHz; Core Size: 32-Bit; Data Converters: A/D 12x12b; Program Memory Type: FLASH; Manufacturer Part Number: STM32F030C8T6TR; Package / Case: 48-LQFP; Operating Temperature: -40°C ~ 85°C (TA); Supplier Device Package: 48-LQFP (7x7); Category: Integrated Circuits (ICs); EEPROM Size: -; Packaging: Tape & Reel (TR); RoHS: RoHS Compliant; Part Status: Active; Supplier: Digi-Key; ComponentLink1URL: http://www.st.com/content/ccc/resource/technical/document/datasheet/a4/5d/0b/0e/87/c4/4d/71/DM00088500.pdf/files/DM00088500.pdf/jcr:content/translations/en.DM00088500.pdf; ComponentLink1Description: http://www.st.com/content/ccc/resource/technical/document/datasheet/a4/5d/0b/0e/87/c4/4d/71/DM00088500.pdf/files/DM00088500.pdf/jcr:content/translations/en.DM00088500.pdf; Supplier Part Number: 497-17331-2-ND; Mounting Type: Surface Mount
footprint LQFP-48-7x7 (hin QFP, 48-Leads, Body 7x7mm, Pitch 0.5mm, IPC Medium Density)
pins: 1 VDD (power), 2 PC13 (io), 3 PC14/OSC32_IN (io), 4 PC15/OSC32_OUT (io), 5 PF0/OSC_IN (io), 6 PF1/OSC_OUT (io), 7 NRST (io), 8 VSSA (power), 9 VDDA (power), 10 PA0 (io), 11 PA1 (io), 12 PA2 (io), 13 PA3 (io), 14 PA4 (io), 15 PA5 (io), 16 PA6 (io), 17 PA7 (io), 18 PB0 (io), 19 PB1 (io), 20 PB2 (io), 21 PB10 (io), 22 PB11 (io), 23 VSS (power), 24 VDD (power), 25 PB12 (io), 26 PB13 (io), 27 PB14 (io), 28 PB15 (io), 29 PA8 (io), 30 PA9 (io), 31 PA10 (io), 32 PA11 (io), 33 PA12 (io), 34 PA13/SWDIO (io), 35 PF6/VSS (power), 36 PF7/VDDIO2 (power), 37 PA14/SWCLK (io), 38 PA15 (io), 39 PB3 (io), 40 PB4 (io), 41 PB5 (io), 42 PB6 (io), 43 PB7 (io), 44 BOOT0 (io), 45 PB8 (io), 46 PB9 (io), 47 VSS (power), 48 VDD (power)